# Altium footprint library ref-packages-longpad.PCBLIB: 1527 footprints (part 73 of 103) (continued)
## SQFP-R-20X28-232 [mm]
pads (232):
  rect 0.25x1.6 smd: 1(-13.4,-10.6) 2(-13,-10.6) 3(-12.6,-10.6) 4(-12.2,-10.6) 5(-11.8,-10.6) 6(-11.4,-10.6) 7(-11,-10.6) 8(-10.6,-10.6) 9(-10.2,-10.6) 10(-9.8,-10.6) 11(-9.4,-10.6) 12(-9,-10.6) 13(-8.6,-10.6) 14(-8.2,-10.6) 15(-7.8,-10.6) 16(-7.4,-10.6) 17(-7,-10.6) 18(-6.6,-10.6) 19(-6.2,-10.6) 20(-5.8,-10.6) 21(-5.4,-10.6) 22(-5,-10.6) 23(-4.6,-10.6) 24(-4.2,-10.6) 25(-3.8,-10.6) 26(-3.4,-10.6) 27(-3,-10.6) 28(-2.6,-10.6) 29(-2.2,-10.6) 30(-1.8,-10.6) 31(-1.4,-10.6) 32(-1,-10.6) 33(-0.6,-10.6) 34(-0.2,-10.6) 35(0.2,-10.6) 36(0.6,-10.6) 37(1,-10.6) 38(1.4,-10.6) 39(1.8,-10.6) 40(2.2,-10.6) 41(2.6,-10.6) 42(3,-10.6) 43(3.4,-10.6) 44(3.8,-10.6) 45(4.2,-10.6) 46(4.6,-10.6) 47(5,-10.6) 48(5.4,-10.6) 49(5.8,-10.6) 50(6.2,-10.6) 51(6.6,-10.6) 52(7,-10.6) 53(7.4,-10.6) 54(7.8,-10.6) 55(8.2,-10.6) 56(8.6,-10.6) 57(9,-10.6) 58(9.4,-10.6) 59(9.8,-10.6) 60(10.2,-10.6) 61(10.6,-10.6) 62(11,-10.6) 63(11.4,-10.6) 64(11.8,-10.6) 65(12.2,-10.6) 66(12.6,-10.6) 67(13,-10.6) 68(13.4,-10.6) 117(13.4,10.6) 118(13,10.6) 119(12.6,10.6) 120(12.2,10.6) 121(11.8,10.6) 122(11.4,10.6) 123(11,10.6) 124(10.6,10.6) 125(10.2,10.6) 126(9.8,10.6) 127(9.4,10.6) 128(9,10.6) 129(8.6,10.6) 130(8.2,10.6) 131(7.8,10.6) 132(7.4,10.6) 133(7,10.6) 134(6.6,10.6) 135(6.2,10.6) 136(5.8,10.6) 137(5.4,10.6) 138(5,10.6) 139(4.6,10.6) 140(4.2,10.6) 141(3.8,10.6) 142(3.4,10.6) 143(3,10.6) 144(2.6,10.6) 145(2.2,10.6) 146(1.8,10.6) 147(1.4,10.6) 148(1,10.6) 149(0.6,10.6) 150(0.2,10.6) 151(-0.2,10.6) 152(-0.6,10.6) 153(-1,10.6) 154(-1.4,10.6) 155(-1.8,10.6) 156(-2.2,10.6) 157(-2.6,10.6) 158(-3,10.6) 159(-3.4,10.6) 160(-3.8,10.6) 161(-4.2,10.6) 162(-4.6,10.6) 163(-5,10.6) 164(-5.4,10.6) 165(-5.8,10.6) 166(-6.2,10.6) 167(-6.6,10.6) 168(-7,10.6) 169(-7.4,10.6) 170(-7.8,10.6) 171(-8.2,10.6) 172(-8.6,10.6) 173(-9,10.6) 174(-9.4,10.6) 175(-9.8,10.6) 176(-10.2,10.6) 177(-10.6,10.6) 178(-11,10.6) 179(-11.4,10.6) 180(-11.8,10.6) 181(-12.2,10.6) 182(-12.6,10.6) 183(-13,10.6) 184(-13.4,10.6)
  rect 1.6x0.25 smd: 69(14.6,-9.4) 70(14.6,-9) 71(14.6,-8.6) 72(14.6,-8.2) 73(14.6,-7.8) 74(14.6,-7.4) 75(14.6,-7) 76(14.6,-6.6) 77(14.6,-6.2) 78(14.6,-5.8) 79(14.6,-5.4) 80(14.6,-5) 81(14.6,-4.6) 82(14.6,-4.2) 83(14.6,-3.8) 84(14.6,-3.4) 85(14.6,-3) 86(14.6,-2.6) 87(14.6,-2.2) 88(14.6,-1.8) 89(14.6,-1.4) 90(14.6,-1) 91(14.6,-0.6) 92(14.6,-0.2) 93(14.6,0.2) 94(14.6,0.6) 95(14.6,1) 96(14.6,1.4) 97(14.6,1.8) 98(14.6,2.2) 99(14.6,2.6) 100(14.6,3) 101(14.6,3.4) 102(14.6,3.8) 103(14.6,4.2) 104(14.6,4.6) 105(14.6,5) 106(14.6,5.4) 107(14.6,5.8) 108(14.6,6.2) 109(14.6,6.6) 110(14.6,7) 111(14.6,7.4) 112(14.6,7.8) 113(14.6,8.2) 114(14.6,8.6) 115(14.6,9) 116(14.6,9.4) 185(-14.6,9.4) 186(-14.6,9) 187(-14.6,8.6) 188(-14.6,8.2) 189(-14.6,7.8) 190(-14.6,7.4) 191(-14.6,7) 192(-14.6,6.6) 193(-14.6,6.2) 194(-14.6,5.8) 195(-14.6,5.4) 196(-14.6,5) 197(-14.6,4.6) 198(-14.6,4.2) 199(-14.6,3.8) 200(-14.6,3.4) 201(-14.6,3) 202(-14.6,2.6) 203(-14.6,2.2) 204(-14.6,1.8) 205(-14.6,1.4) 206(-14.6,1) 207(-14.6,0.6) 208(-14.6,0.2) 209(-14.6,-0.2) 210(-14.6,-0.6) 211(-14.6,-1) 212(-14.6,-1.4) 213(-14.6,-1.8) 214(-14.6,-2.2) 215(-14.6,-2.6) 216(-14.6,-3) 217(-14.6,-3.4) 218(-14.6,-3.8) 219(-14.6,-4.2) 220(-14.6,-4.6) 221(-14.6,-5) 222(-14.6,-5.4) 223(-14.6,-5.8) 224(-14.6,-6.2) 225(-14.6,-6.6) 226(-14.6,-7) 227(-14.6,-7.4) 228(-14.6,-7.8) 229(-14.6,-8.2) 230(-14.6,-8.6) 231(-14.6,-9) 232(-14.6,-9.4)
Top Overlay:
  circle w0.254: c-12.25,-8.5 r0.75
  lines w0.203: -13.57,-9.56 13.56,-9.56 13.56,9.56 -13.57,9.56 -13.57,-9.56
Mechanical 16:
  drawing of 236 lines, arcs and shapes, not listed
Mechanical 27:
  lines w0.2: -16.4,-11.9 -16.4,11.9 16.4,11.9 16.4,-11.9 -16.4,-11.9

## SQFP-R-20X28-300 [mm]
pads (300):
  rect 0.17x1.6 smd: 1(-13.05,-10.6) 2(-12.75,-10.6) 3(-12.45,-10.6) 4(-12.15,-10.6) 5(-11.85,-10.6) 6(-11.55,-10.6) 7(-11.25,-10.6) 8(-10.95,-10.6) 9(-10.65,-10.6) 10(-10.35,-10.6) 11(-10.05,-10.6) 12(-9.75,-10.6) 13(-9.45,-10.6) 14(-9.15,-10.6) 15(-8.85,-10.6) 16(-8.55,-10.6) 17(-8.25,-10.6) 18(-7.95,-10.6) 19(-7.65,-10.6) 20(-7.35,-10.6) 21(-7.05,-10.6) 22(-6.75,-10.6) 23(-6.45,-10.6) 24(-6.15,-10.6) 25(-5.85,-10.6) 26(-5.55,-10.6) 27(-5.25,-10.6) 28(-4.95,-10.6) 29(-4.65,-10.6) 30(-4.35,-10.6) 31(-4.05,-10.6) 32(-3.75,-10.6) 33(-3.45,-10.6) 34(-3.15,-10.6) 35(-2.85,-10.6) 36(-2.55,-10.6) 37(-2.25,-10.6) 38(-1.95,-10.6) 39(-1.65,-10.6) 40(-1.35,-10.6) 41(-1.05,-10.6) 42(-0.75,-10.6) 43(-0.45,-10.6) 44(-0.15,-10.6) 45(0.15,-10.6) 46(0.45,-10.6) 47(0.75,-10.6) 48(1.05,-10.6) 49(1.35,-10.6) 50(1.65,-10.6) 51(1.95,-10.6) 52(2.25,-10.6) 53(2.55,-10.6) 54(2.85,-10.6) 55(3.15,-10.6) 56(3.45,-10.6) 57(3.75,-10.6) 58(4.05,-10.6) 59(4.35,-10.6) 60(4.65,-10.6) 61(4.95,-10.6) 62(5.25,-10.6) 63(5.55,-10.6) 64(5.85,-10.6) 65(6.15,-10.6) 66(6.45,-10.6) 67(6.75,-10.6) 68(7.05,-10.6) 69(11.55,-10.6) 70(7.35,-10.6) 71(7.65,-10.6) 72(7.95,-10.6) 73(8.25,-10.6) 74(8.55,-10.6) 75(8.85,-10.6) 76(9.15,-10.6) 77(9.45,-10.6) 78(9.75,-10.6) 79(10.05,-10.6) 80(10.35,-10.6) 81(10.65,-10.6) 82(10.95,-10.6) 83(11.25,-10.6) 84(11.85,-10.6) 85(12.15,-10.6) 86(12.45,-10.6) 87(12.75,-10.6) 88(13.05,-10.6) 151(13.05,10.6) 152(12.75,10.6) 153(12.45,10.6) 154(12.15,10.6) 155(11.85,10.6) 156(11.55,10.6) 157(11.25,10.6) 158(10.95,10.6) 159(10.65,10.6) 160(10.35,10.6) 161(10.05,10.6) 162(9.75,10.6) 163(9.45,10.6) 164(9.15,10.6) 165(8.85,10.6) 166(8.55,10.6) 167(8.25,10.6) 168(7.95,10.6) 169(7.65,10.6) 170(7.35,10.6) 171(7.05,10.6) 172(6.75,10.6) 173(6.45,10.6) 174(6.15,10.6) 175(5.85,10.6) 176(5.55,10.6) 177(5.25,10.6) 178(4.95,10.6) 179(4.65,10.6) 180(4.35,10.6) 181(4.05,10.6) 182(3.75,10.6) 183(3.45,10.6) 184(3.15,10.6) 185(2.85,10.6) 186(2.55,10.6) 187(2.25,10.6) 188(1.95,10.6) 189(1.65,10.6) 190(1.35,10.6) 191(1.05,10.6) 192(0.75,10.6) 193(0.45,10.6) 194(0.15,10.6) 195(-0.15,10.6) 196(-0.45,10.6) 197(-0.75,10.6) 198(-1.05,10.6) 199(-1.35,10.6) 200(-1.65,10.6) 201(-1.95,10.6) 202(-2.25,10.6) 203(-2.55,10.6) 204(-2.85,10.6) 205(-3.15,10.6) 206(-3.45,10.6) 207(-3.75,10.6) 208(-4.05,10.6) 209(-4.35,10.6) 210(-4.65,10.6) 211(-4.95,10.6) 212(-5.25,10.6) 213(-5.55,10.6) 214(-5.85,10.6) 215(-6.15,10.6) 216(-6.45,10.6) 217(-6.75,10.6) 218(-7.05,10.6) 219(-7.35,10.6) 220(-7.65,10.6) 221(-7.95,10.6) 222(-8.25,10.6) 223(-8.55,10.6) 224(-8.85,10.6) 225(-9.15,10.6) 226(-9.45,10.6) 227(-9.75,10.6) 228(-10.05,10.6) 229(-10.35,10.6) 230(-10.65,10.6) 231(-10.95,10.6) 232(-11.25,10.6) 233(-11.55,10.6) 234(-11.85,10.6) 235(-12.15,10.6) 236(-12.45,10.6) 237(-12.75,10.6) 238(-13.05,10.6)
  rect 1.6x0.17 smd: 89(14.6,-9.15) 90(14.6,-8.85) 91(14.6,-8.55) 92(14.6,-8.25) 93(14.6,-7.95) 94(14.6,-7.65) 95(14.6,-7.35) 96(14.6,-7.05) 97(14.6,-6.75) 98(14.6,-6.45) 99(14.6,-6.15) 100(14.6,-5.85) 101(14.6,-5.55) 102(14.6,-5.25) 103(14.6,-4.95) 104(14.6,-4.65) 105(14.6,-4.35) 106(14.6,-4.05) 107(14.6,-3.75) 108(14.6,-3.45) 109(14.6,-3.15) 110(14.6,-2.85) 111(14.6,-2.55) 112(14.6,-2.25) 113(14.6,-1.95) 114(14.6,-1.65) 115(14.6,-1.35) 116(14.6,-1.05) 117(14.6,-0.75) 118(14.6,-0.45) 119(14.6,-0.15) 120(14.6,0.15) 121(14.6,0.45) 122(14.6,0.75) 123(14.6,1.05) 124(14.6,1.35) 125(14.6,1.65) 126(14.6,1.95) 127(14.6,2.25) 128(14.6,2.55) 129(14.6,2.85) 130(14.6,3.15) 131(14.6,3.45) 132(14.6,3.75) 133(14.6,4.05) 134(14.6,4.35) 135(14.6,4.65) 136(14.6,4.95) 137(14.6,5.25) 138(14.6,5.55) 139(14.6,5.85) 140(14.6,6.15) 141(14.6,6.45) 142(14.6,6.75) 143(14.6,7.05) 144(14.6,7.35) 145(14.6,7.65) 146(14.6,7.95) 147(14.6,8.25) 148(14.6,8.55) 149(14.6,8.85) 150(14.6,9.15) 239(-14.6,9.15) 240(-14.6,8.85) 241(-14.6,8.55) 242(-14.6,8.25) 243(-14.6,7.95) 244(-14.6,7.65) 245(-14.6,7.35) 246(-14.6,7.05) 247(-14.6,6.75) 248(-14.6,6.45) 249(-14.6,6.15) 250(-14.6,5.85) 251(-14.6,5.55) 252(-14.6,5.25) 253(-14.6,4.95) 254(-14.6,4.65) 255(-14.6,4.35) 256(-14.6,4.05) 257(-14.6,3.75) 258(-14.6,3.45) 259(-14.6,3.15) 260(-14.6,2.85) 261(-14.6,2.55) 262(-14.6,2.25) 263(-14.6,1.95) 264(-14.6,1.65) 265(-14.6,1.35) 266(-14.6,1.05) 267(-14.6,0.75) 268(-14.6,0.45) 269(-14.6,0.15) 270(-14.6,-0.15) 271(-14.6,-0.45) 272(-14.6,-0.75) 273(-14.6,-1.05) 274(-14.6,-1.35) 275(-14.6,-1.65) 276(-14.6,-1.95) 277(-14.6,-2.25) 278(-14.6,-2.55) 279(-14.6,-2.85) 280(-14.6,-3.15) 281(-14.6,-3.45) 282(-14.6,-3.75) 283(-14.6,-4.05) 284(-14.6,-4.35) 285(-14.6,-4.65) 286(-14.6,-4.95) 287(-14.6,-5.25) 288(-14.6,-5.55) 289(-14.6,-5.85) 290(-14.6,-6.15) 291(-14.6,-6.45) 292(-14.6,-6.75) 293(-14.6,-7.05) 294(-14.6,-7.35) 295(-14.6,-7.65) 296(-14.6,-7.95) 297(-14.6,-8.25) 298(-14.6,-8.55) 299(-14.6,-8.85) 300(-14.6,-9.15)
Top Overlay:
  circle w0.254: c-12.25,-8.5 r0.75
  lines w0.203: -13.57,-9.56 13.56,-9.56 13.56,9.56 -13.57,9.56 -13.57,-9.56
Mechanical 16:
  drawing of 304 lines, arcs and shapes, not listed
Mechanical 27:
  lines w0.2: -16.4,-11.9 -16.4,11.9 16.4,11.9 16.4,-11.9 -16.4,-11.9

## SQFP-R-20X28-308 [mm]
pads (308):
  rect 0.17x1.6 smd: 1(-13.35,-10.6) 2(-13.05,-10.6) 3(-12.75,-10.6) 4(-12.45,-10.6) 5(-12.15,-10.6) 6(-11.85,-10.6) 7(-11.55,-10.6) 8(-11.25,-10.6) 9(-10.95,-10.6) 10(-10.65,-10.6) 11(-10.35,-10.6) 12(-10.05,-10.6) 13(-9.75,-10.6) 14(-9.45,-10.6) 15(-9.15,-10.6) 16(-8.85,-10.6) 17(-8.55,-10.6) 18(-8.25,-10.6) 19(-7.95,-10.6) 20(-7.65,-10.6) 21(-7.35,-10.6) 22(-7.05,-10.6) 23(-6.75,-10.6) 24(-6.45,-10.6) 25(-6.15,-10.6) 26(-5.85,-10.6) 27(-5.55,-10.6) 28(-5.25,-10.6) 29(-4.95,-10.6) 30(-4.65,-10.6) 31(-4.35,-10.6) 32(-4.05,-10.6) 33(-3.75,-10.6) 34(-3.45,-10.6) 35(-3.15,-10.6) 36(-2.85,-10.6) 37(-2.55,-10.6) 38(-2.25,-10.6) 39(-1.95,-10.6) 40(-1.65,-10.6) 41(-1.35,-10.6) 42(-1.05,-10.6) 43(-0.75,-10.6) 44(-0.45,-10.6) 45(-0.15,-10.6) 46(0.15,-10.6) 47(0.45,-10.6) 48(0.75,-10.6) 49(1.05,-10.6) 50(1.35,-10.6) 51(1.65,-10.6) 52(1.95,-10.6) 53(2.25,-10.6) 54(2.55,-10.6) 55(2.85,-10.6) 56(3.15,-10.6) 57(3.45,-10.6) 58(3.75,-10.6) 59(4.05,-10.6) 60(4.35,-10.6) 61(4.65,-10.6) 62(4.95,-10.6) 63(5.25,-10.6) 64(5.55,-10.6) 65(5.85,-10.6) 66(6.15,-10.6) 67(6.45,-10.6) 68(6.75,-10.6) 69(11.25,-10.6) 70(7.05,-10.6) 71(7.35,-10.6) 72(7.65,-10.6) 73(7.95,-10.6) 74(8.25,-10.6) 75(8.55,-10.6) 76(8.85,-10.6) 77(9.15,-10.6) 78(9.45,-10.6) 79(9.75,-10.6) 80(10.05,-10.6) 81(10.35,-10.6) 82(10.65,-10.6) 83(10.95,-10.6) 84(11.55,-10.6) 85(11.85,-10.6) 86(12.15,-10.6) 87(12.45,-10.6) 88(12.75,-10.6) 89(13.05,-10.6) 90(13.35,-10.6) 155(13.35,10.6) 156(13.05,10.6) 157(12.75,10.6) 158(12.45,10.6) 159(12.15,10.6) 160(11.85,10.6) 161(11.55,10.6) 162(11.25,10.6) 163(10.95,10.6) 164(10.65,10.6) 165(10.35,10.6) 166(10.05,10.6) 167(9.75,10.6) 168(9.45,10.6) 169(9.15,10.6) 170(8.85,10.6) 171(8.55,10.6) 172(8.25,10.6) 173(7.95,10.6) 174(7.65,10.6) 175(7.35,10.6) 176(7.05,10.6) 177(6.75,10.6) 178(6.45,10.6) 179(6.15,10.6) 180(5.85,10.6) 181(5.55,10.6) 182(5.25,10.6) 183(4.95,10.6) 184(4.65,10.6) 185(4.35,10.6) 186(4.05,10.6) 187(3.75,10.6) 188(3.45,10.6) 189(3.15,10.6) 190(2.85,10.6) 191(2.55,10.6) 192(2.25,10.6) 193(1.95,10.6) 194(1.65,10.6) 195(1.35,10.6) 196(1.05,10.6) 197(0.75,10.6) 198(0.45,10.6) 199(0.15,10.6) 200(-0.15,10.6) 201(-0.45,10.6) 202(-0.75,10.6) 203(-1.05,10.6) 204(-1.35,10.6) 205(-1.65,10.6) 206(-1.95,10.6) 207(-2.25,10.6) 208(-2.55,10.6) 209(-2.85,10.6) 210(-3.15,10.6) 211(-3.45,10.6) 212(-3.75,10.6) 213(-4.05,10.6) 214(-4.35,10.6) 215(-4.65,10.6) 216(-4.95,10.6) 217(-5.25,10.6) 218(-5.55,10.6) 219(-5.85,10.6) 220(-6.15,10.6) 221(-6.45,10.6) 222(-6.75,10.6) 223(-7.05,10.6) 224(-7.35,10.6) 225(-7.65,10.6) 226(-7.95,10.6) 227(-8.25,10.6) 228(-8.55,10.6) 229(-8.85,10.6) 230(-9.15,10.6) 231(-9.45,10.6) 232(-9.75,10.6) 233(-10.05,10.6) 234(-10.35,10.6) 235(-10.65,10.6) 236(-10.95,10.6) 237(-11.25,10.6) 238(-11.55,10.6) 239(-11.85,10.6) 240(-12.15,10.6) 241(-12.45,10.6) 242(-12.75,10.6) 243(-13.05,10.6) 244(-13.35,10.6)
  rect 1.6x0.17 smd: 91(14.6,-9.45) 92(14.6,-9.15) 93(14.6,-8.85) 94(14.6,-8.55) 95(14.6,-8.25) 96(14.6,-7.95) 97(14.6,-7.65) 98(14.6,-7.35) 99(14.6,-7.05) 100(14.6,-6.75) 101(14.6,-6.45) 102(14.6,-6.15) 103(14.6,-5.85) 104(14.6,-5.55) 105(14.6,-5.25) 106(14.6,-4.95) 107(14.6,-4.65) 108(14.6,-4.35) 109(14.6,-4.05) 110(14.6,-3.75) 111(14.6,-3.45) 112(14.6,-3.15) 113(14.6,-2.85) 114(14.6,-2.55) 115(14.6,-2.25) 116(14.6,-1.95) 117(14.6,-1.65) 118(14.6,-1.35) 119(14.6,-1.05) 120(14.6,-0.75) 121(14.6,-0.45) 122(14.6,-0.15) 123(14.6,0.15) 124(14.6,0.45) 125(14.6,0.75) 126(14.6,1.05) 127(14.6,1.35) 128(14.6,1.65) 129(14.6,1.95) 130(14.6,2.25) 131(14.6,2.55) 132(14.6,2.85) 133(14.6,3.15) 134(14.6,3.45) 135(14.6,3.75) 136(14.6,4.05) 137(14.6,4.35) 138(14.6,4.65) 139(14.6,4.95) 140(14.6,5.25) 141(14.6,5.55) 142(14.6,5.85) 143(14.6,6.15) 144(14.6,6.45) 145(14.6,6.75) 146(14.6,7.05) 147(14.6,7.35) 148(14.6,7.65) 149(14.6,7.95) 150(14.6,8.25) 151(14.6,8.55) 152(14.6,8.85) 153(14.6,9.15) 154(14.6,9.45) 245(-14.6,9.45) 246(-14.6,9.15) 247(-14.6,8.85) 248(-14.6,8.55) 249(-14.6,8.25) 250(-14.6,7.95) 251(-14.6,7.65) 252(-14.6,7.35) 253(-14.6,7.05) 254(-14.6,6.75) 255(-14.6,6.45) 256(-14.6,6.15) 257(-14.6,5.85) 258(-14.6,5.55) 259(-14.6,5.25) 260(-14.6,4.95) 261(-14.6,4.65) 262(-14.6,4.35) 263(-14.6,4.05) 264(-14.6,3.75) 265(-14.6,3.45) 266(-14.6,3.15) 267(-14.6,2.85) 268(-14.6,2.55) 269(-14.6,2.25) 270(-14.6,1.95) 271(-14.6,1.65) 272(-14.6,1.35) 273(-14.6,1.05) 274(-14.6,0.75) 275(-14.6,0.45) 276(-14.6,0.15) 277(-14.6,-0.15) 278(-14.6,-0.45) 279(-14.6,-0.75) 280(-14.6,-1.05) 281(-14.6,-1.35) 282(-14.6,-1.65) 283(-14.6,-1.95) 284(-14.6,-2.25) 285(-14.6,-2.55) 286(-14.6,-2.85) 287(-14.6,-3.15) 288(-14.6,-3.45) 289(-14.6,-3.75) 290(-14.6,-4.05) 291(-14.6,-4.35) 292(-14.6,-4.65) 293(-14.6,-4.95) 294(-14.6,-5.25) 295(-14.6,-5.55) 296(-14.6,-5.85) 297(-14.6,-6.15) 298(-14.6,-6.45) 299(-14.6,-6.75) 300(-14.6,-7.05) 301(-14.6,-7.35) 302(-14.6,-7.65) 303(-14.6,-7.95) 304(-14.6,-8.25) 305(-14.6,-8.55) 306(-14.6,-8.85) 307(-14.6,-9.15) 308(-14.6,-9.45)
Top Overlay:
  circle w0.254: c-12.25,-8.5 r0.75
  lines w0.203: -13.57,-9.56 13.56,-9.56 13.56,9.56 -13.57,9.56 -13.57,-9.56
Mechanical 16:
  drawing of 312 lines, arcs and shapes, not listed
Mechanical 27:
  lines w0.2: -16.4,-11.9 -16.4,11.9 16.4,11.9 16.4,-11.9 -16.4,-11.9

## SQFP-R-28X40-256 [mil]
pads (256):
  rect 11.81x62.99 smd: 1(-738.19,-574.8) 2(-718.5,-574.8) 3(-698.82,-574.8) 4(-679.13,-574.8) 5(-659.45,-574.8) 6(-639.76,-574.8) 7(-620.08,-574.8) 8(-600.39,-574.8) 9(-580.71,-574.8) 10(-561.02,-574.8) 11(-541.34,-574.8) 12(-521.65,-574.8) 13(-501.97,-574.8) 14(-482.28,-574.8) 15(-462.6,-574.8) 16(-442.91,-574.8) 17(-423.23,-574.8) 18(-403.54,-574.8) 19(-383.86,-574.8) 20(-364.17,-574.8) 21(-344.49,-574.8) 22(-324.8,-574.8) 23(-305.12,-574.8) 24(-285.43,-574.8) 25(-265.75,-574.8) 26(-246.06,-574.8) 27(-226.38,-574.8) 28(-206.69,-574.8) 29(-187.01,-574.8) 30(-167.32,-574.8) 31(-147.64,-574.8) 32(-127.95,-574.8) 33(-108.27,-574.8) 34(-88.58,-574.8) 35(-68.9,-574.8) 36(-49.21,-574.8) 37(-29.53,-574.8) 38(-9.84,-574.8) 39(9.84,-574.8) 40(29.53,-574.8) 41(49.21,-574.8) 42(68.9,-574.8) 43(88.58,-574.8) 44(108.27,-574.8) 45(127.95,-574.8) 46(147.64,-574.8) 47(167.32,-574.8) 48(187.01,-574.8) 49(206.69,-574.8) 50(226.38,-574.8) 51(246.06,-574.8) 52(265.75,-574.8) 53(285.43,-574.8) 54(305.12,-574.8) 55(324.8,-574.8) 56(344.49,-574.8) 57(364.17,-574.8) 58(383.86,-574.8) 59(403.54,-574.8) 60(423.23,-574.8) 61(442.91,-574.8) 62(462.6,-574.8) 63(482.28,-574.8) 64(501.97,-574.8) 65(521.65,-574.8) 66(541.34,-574.8) 67(561.02,-574.8) 68(580.71,-574.8) 69(600.39,-574.8) 70(620.08,-574.8) 71(639.76,-574.8) 72(659.45,-574.8) 73(679.13,-574.8) 74(698.82,-574.8) 75(718.5,-574.8) 76(738.19,-574.8) 129(738.19,574.8) 130(718.5,574.8) 131(698.82,574.8) 132(679.13,574.8) 133(659.45,574.8) 134(639.76,574.8) 135(620.08,574.8) 136(600.39,574.8) 137(580.71,574.8) 138(561.02,574.8) 139(541.34,574.8) 140(521.65,574.8) 141(501.97,574.8) 142(482.28,574.8) 143(462.6,574.8) 144(442.91,574.8) 145(423.23,574.8) 146(403.54,574.8) 147(383.86,574.8) 148(364.17,574.8) 149(344.49,574.8) 150(324.8,574.8) 151(305.12,574.8) 152(285.43,574.8) 153(265.75,574.8) 154(246.06,574.8) 155(226.38,574.8) 156(206.69,574.8) 157(187.01,574.8) 158(167.32,574.8) 159(147.64,574.8) 160(127.95,574.8) 161(108.27,574.8) 162(88.58,574.8) 163(68.9,574.8) 164(49.21,574.8) 165(29.53,574.8) 166(9.84,574.8) 167(-9.84,574.8) 168(-29.53,574.8) 169(-49.21,574.8) 170(-68.9,574.8) 171(-88.58,574.8) 172(-108.27,574.8) 173(-127.95,574.8) 174(-147.64,574.8) 175(-167.32,574.8) 176(-187.01,574.8) 177(-206.69,574.8) 178(-226.38,574.8) 179(-246.06,574.8) 180(-265.75,574.8) 181(-285.43,574.8) 182(-305.12,574.8) 183(-324.8,574.8) 184(-344.49,574.8) 185(-364.17,574.8) 186(-383.86,574.8) 187(-403.54,574.8) 188(-423.23,574.8) 189(-442.91,574.8) 190(-462.6,574.8) 191(-482.28,574.8) 192(-501.97,574.8) 193(-521.65,574.8) 194(-541.34,574.8) 195(-561.02,574.8) 196(-580.71,574.8) 197(-600.39,574.8) 198(-620.08,574.8) 199(-639.76,574.8) 200(-659.45,574.8) 201(-679.13,574.8) 202(-698.82,574.8) 203(-718.5,574.8) 204(-738.19,574.8)
  rect 62.99x11.81 smd: 77(811.02,-501.97) 78(811.02,-482.28) 79(811.02,-462.6) 80(811.02,-442.91) 81(811.02,-423.23) 82(811.02,-403.54) 83(811.02,-383.86) 84(811.02,-364.17) 85(811.02,-344.49) 86(811.02,-324.8) 87(811.02,-305.12) 88(811.02,-285.43) 89(811.02,-265.75) 90(811.02,-246.06) 91(811.02,-226.38) 92(811.02,-206.69) 93(811.02,-187.01) 94(811.02,-167.32) 95(811.02,-147.64) 96(811.02,-127.95) 97(811.02,-108.27) 98(811.02,-88.58) 99(811.02,-68.9) 100(811.02,-49.21) 101(811.02,-29.53) 102(811.02,-9.84) 103(811.02,9.84) 104(811.02,29.53) 105(811.02,49.21) 106(811.02,68.9) 107(811.02,88.58) 108(811.02,108.27) 109(811.02,127.95) 110(811.02,147.64) 111(811.02,167.32) 112(811.02,187.01) 113(811.02,206.69) 114(811.02,226.38) 115(811.02,246.06) 116(811.02,265.75) 117(811.02,285.43) 118(811.02,305.12) 119(811.02,324.8) 120(811.02,344.49) 121(811.02,364.17) 122(811.02,383.86) 123(811.02,403.54) 124(811.02,423.23) 125(811.02,442.91) 126(811.02,462.6) 127(811.02,482.28) 128(811.02,501.97) 205(-811.02,501.97) 206(-811.02,482.28) 207(-811.02,462.6) 208(-811.02,442.91) 209(-811.02,423.23) 210(-811.02,403.54) 211(-811.02,383.86) 212(-811.02,364.17) 213(-811.02,344.49) 214(-811.02,324.8) 215(-811.02,305.12) 216(-811.02,285.43) 217(-811.02,265.75) 218(-811.02,246.06) 219(-811.02,226.38) 220(-811.02,206.69) 221(-811.02,187.01) 222(-811.02,167.32) 223(-811.02,147.64) 224(-811.02,127.95) 225(-811.02,108.27) 226(-811.02,88.58) 227(-811.02,68.9) 228(-811.02,49.21) 229(-811.02,29.53) 230(-811.02,9.84) 231(-811.02,-9.84) 232(-811.02,-29.53) 233(-811.02,-49.21) 234(-811.02,-68.9) 235(-811.02,-88.58) 236(-811.02,-108.27) 237(-811.02,-127.95) 238(-811.02,-147.64) 239(-811.02,-167.32) 240(-811.02,-187.01) 241(-811.02,-206.69) 242(-811.02,-226.38) 243(-811.02,-246.06) 244(-811.02,-265.75) 245(-811.02,-285.43) 246(-811.02,-305.12) 247(-811.02,-324.8) 248(-811.02,-344.49) 249(-811.02,-364.17) 250(-811.02,-383.86) 251(-811.02,-403.54) 252(-811.02,-423.23) 253(-811.02,-442.91) 254(-811.02,-462.6) 255(-811.02,-482.28) 256(-811.02,-501.97)
Top Overlay:
  circle w10: c-698.82,-472.44 r29.53
  lines w8: -770.47,-533.86 770.08,-533.86 770.08,533.86 -770.47,533.86 -770.47,-533.86
Mechanical 16:
  drawing of 260 lines, arcs and shapes, not listed
Mechanical 27:
  lines w7.87: -862.2,-645.67 -862.2,645.67 862.2,645.67 862.2,-645.67 -862.2,-645.67

## SQFP-R-28X40-264 [mil]
pads (264):
  rect 11.81x62.99 smd: 1(-757.87,-574.8) 2(-738.19,-574.8) 3(-718.5,-574.8) 4(-698.82,-574.8) 5(-679.13,-574.8) 6(-659.45,-574.8) 7(-639.76,-574.8) 8(-620.08,-574.8) 9(-600.39,-574.8) 10(-580.71,-574.8) 11(-561.02,-574.8) 12(-541.34,-574.8) 13(-521.65,-574.8) 14(-501.97,-574.8) 15(-482.28,-574.8) 16(-462.6,-574.8) 17(-442.91,-574.8) 18(-423.23,-574.8) 19(-403.54,-574.8) 20(-383.86,-574.8) 21(-364.17,-574.8) 22(-344.49,-574.8) 23(-324.8,-574.8) 24(-305.12,-574.8) 25(-285.43,-574.8) 26(-265.75,-574.8) 27(-246.06,-574.8) 28(-226.38,-574.8) 29(-206.69,-574.8) 30(-187.01,-574.8) 31(-167.32,-574.8) 32(-147.64,-574.8) 33(-127.95,-574.8) 34(-108.27,-574.8) 35(-88.58,-574.8) 36(-68.9,-574.8) 37(-49.21,-574.8) 38(-29.53,-574.8) 39(-9.84,-574.8) 40(9.84,-574.8) 41(29.53,-574.8) 42(49.21,-574.8) 43(68.9,-574.8) 44(88.58,-574.8) 45(108.27,-574.8) 46(127.95,-574.8) 47(147.64,-574.8) 48(167.32,-574.8) 49(187.01,-574.8) 50(206.69,-574.8) 51(226.38,-574.8) 52(246.06,-574.8) 53(265.75,-574.8) 54(285.43,-574.8) 55(305.12,-574.8) 56(324.8,-574.8) 57(344.49,-574.8) 58(364.17,-574.8) 59(383.86,-574.8) 60(403.54,-574.8) 61(423.23,-574.8) 62(442.91,-574.8) 63(462.6,-574.8) 64(482.28,-574.8) 65(501.97,-574.8) 66(521.65,-574.8) 67(541.34,-574.8) 68(561.02,-574.8) 69(580.71,-574.8) 70(600.39,-574.8) 71(620.08,-574.8) 72(639.76,-574.8) 73(659.45,-574.8) 74(679.13,-574.8) 75(698.82,-574.8) 76(718.5,-574.8) 77(738.19,-574.8) 78(757.87,-574.8) 133(757.87,574.8) 134(738.19,574.8) 135(718.5,574.8) 136(698.82,574.8) 137(679.13,574.8) 138(659.45,574.8) 139(639.76,574.8) 140(620.08,574.8) 141(600.39,574.8) 142(580.71,574.8) 143(561.02,574.8) 144(541.34,574.8) 145(521.65,574.8) 146(501.97,574.8) 147(482.28,574.8) 148(462.6,574.8) 149(442.91,574.8) 150(423.23,574.8) 151(403.54,574.8) 152(383.86,574.8) 153(364.17,574.8) 154(344.49,574.8) 155(324.8,574.8) 156(305.12,574.8) 157(285.43,574.8) 158(265.75,574.8) 159(246.06,574.8) 160(226.38,574.8) 161(206.69,574.8) 162(187.01,574.8) 163(167.32,574.8) 164(147.64,574.8) 165(127.95,574.8) 166(108.27,574.8) 167(88.58,574.8) 168(68.9,574.8) 169(49.21,574.8) 170(29.53,574.8) 171(9.84,574.8) 172(-9.84,574.8) 173(-29.53,574.8) 174(-49.21,574.8) 175(-68.9,574.8) 176(-88.58,574.8) 177(-108.27,574.8) 178(-127.95,574.8) 179(-147.64,574.8) 180(-167.32,574.8) 181(-187.01,574.8) 182(-206.69,574.8) 183(-226.38,574.8) 184(-246.06,574.8) 185(-265.75,574.8) 186(-285.43,574.8) 187(-305.12,574.8) 188(-324.8,574.8) 189(-344.49,574.8) 190(-364.17,574.8) 191(-383.86,574.8) 192(-403.54,574.8) 193(-423.23,574.8) 194(-442.91,574.8) 195(-462.6,574.8) 196(-482.28,574.8) 197(-501.97,574.8) 198(-521.65,574.8) 199(-541.34,574.8) 200(-561.02,574.8) 201(-580.71,574.8) 202(-600.39,574.8) 203(-620.08,574.8) 204(-639.76,574.8) 205(-659.45,574.8) 206(-679.13,574.8) 207(-698.82,574.8) 208(-718.5,574.8) 209(-738.19,574.8) 210(-757.87,574.8)
  rect 62.99x11.81 smd: 79(811.02,-521.65) 80(811.02,-501.97) 81(811.02,-482.28) 82(811.02,-462.6) 83(811.02,-442.91) 84(811.02,-423.23) 85(811.02,-403.54) 86(811.02,-383.86) 87(811.02,-364.17) 88(811.02,-344.49) 89(811.02,-324.8) 90(811.02,-305.12) 91(811.02,-285.43) 92(811.02,-265.75) 93(811.02,-246.06) 94(811.02,-226.38) 95(811.02,-206.69) 96(811.02,-187.01) 97(811.02,-167.32) 98(811.02,-147.64) 99(811.02,-127.95) 100(811.02,-108.27) 101(811.02,-88.58) 102(811.02,-68.9) 103(811.02,-49.21) 104(811.02,-29.53) 105(811.02,-9.84) 106(811.02,9.84) 107(811.02,29.53) 108(811.02,49.21) 109(811.02,68.9) 110(811.02,88.58) 111(811.02,108.27) 112(811.02,127.95) 113(811.02,147.64) 114(811.02,167.32) 115(811.02,187.01) 116(811.02,206.69) 117(811.02,226.38) 118(811.02,246.06) 119(811.02,265.75) 120(811.02,285.43) 121(811.02,305.12) 122(811.02,324.8) 123(811.02,344.49) 124(811.02,364.17) 125(811.02,383.86) 126(811.02,403.54) 127(811.02,423.23) 128(811.02,442.91) 129(811.02,462.6) 130(811.02,482.28) 131(811.02,501.97) 132(811.02,521.65) 211(-811.02,521.65) 212(-811.02,501.97) 213(-811.02,482.28) 214(-811.02,462.6) 215(-811.02,442.91) 216(-811.02,423.23) 217(-811.02,403.54) 218(-811.02,383.86) 219(-811.02,364.17) 220(-811.02,344.49) 221(-811.02,324.8) 222(-811.02,305.12) 223(-811.02,285.43) 224(-811.02,265.75) 225(-811.02,246.06) 226(-811.02,226.38) 227(-811.02,206.69) 228(-811.02,187.01) 229(-811.02,167.32) 230(-811.02,147.64) 231(-811.02,127.95) 232(-811.02,108.27) 233(-811.02,88.58) 234(-811.02,68.9) 235(-811.02,49.21) 236(-811.02,29.53) 237(-811.02,9.84) 238(-811.02,-9.84) 239(-811.02,-29.53) 240(-811.02,-49.21) 241(-811.02,-68.9) 242(-811.02,-88.58) 243(-811.02,-108.27) 244(-811.02,-127.95) 245(-811.02,-147.64) 246(-811.02,-167.32) 247(-811.02,-187.01) 248(-811.02,-206.69) 249(-811.02,-226.38) 250(-811.02,-246.06) 251(-811.02,-265.75) 252(-811.02,-285.43) 253(-811.02,-305.12) 254(-811.02,-324.8) 255(-811.02,-344.49) 256(-811.02,-364.17) 257(-811.02,-383.86) 258(-811.02,-403.54) 259(-811.02,-423.23) 260(-811.02,-442.91) 261(-811.02,-462.6) 262(-811.02,-482.28) 263(-811.02,-501.97) 264(-811.02,-521.65)
Top Overlay:
  circle w10: c-698.82,-472.44 r29.53
  lines w8: -770.47,-533.86 770.08,-533.86 770.08,533.86 -770.47,533.86 -770.47,-533.86
Mechanical 16:
  drawing of 268 lines, arcs and shapes, not listed
Mechanical 27:
  lines w7.87: -862.2,-645.67 -862.2,645.67 862.2,645.67 862.2,-645.67 -862.2,-645.67